# Altium footprint library MCU.PcbLib: 87 footprints (part 5 of 6)
Each footprint in its own frame and in the unit in brackets; x right, y up, seen from the top. Pads: shape width x height; smd on the part's side, far side on the other; paste and mask are expansions set on the pad; w line width, h text height; cw(c..) or ccw(c..) is an arc to the next point about the centre after c.
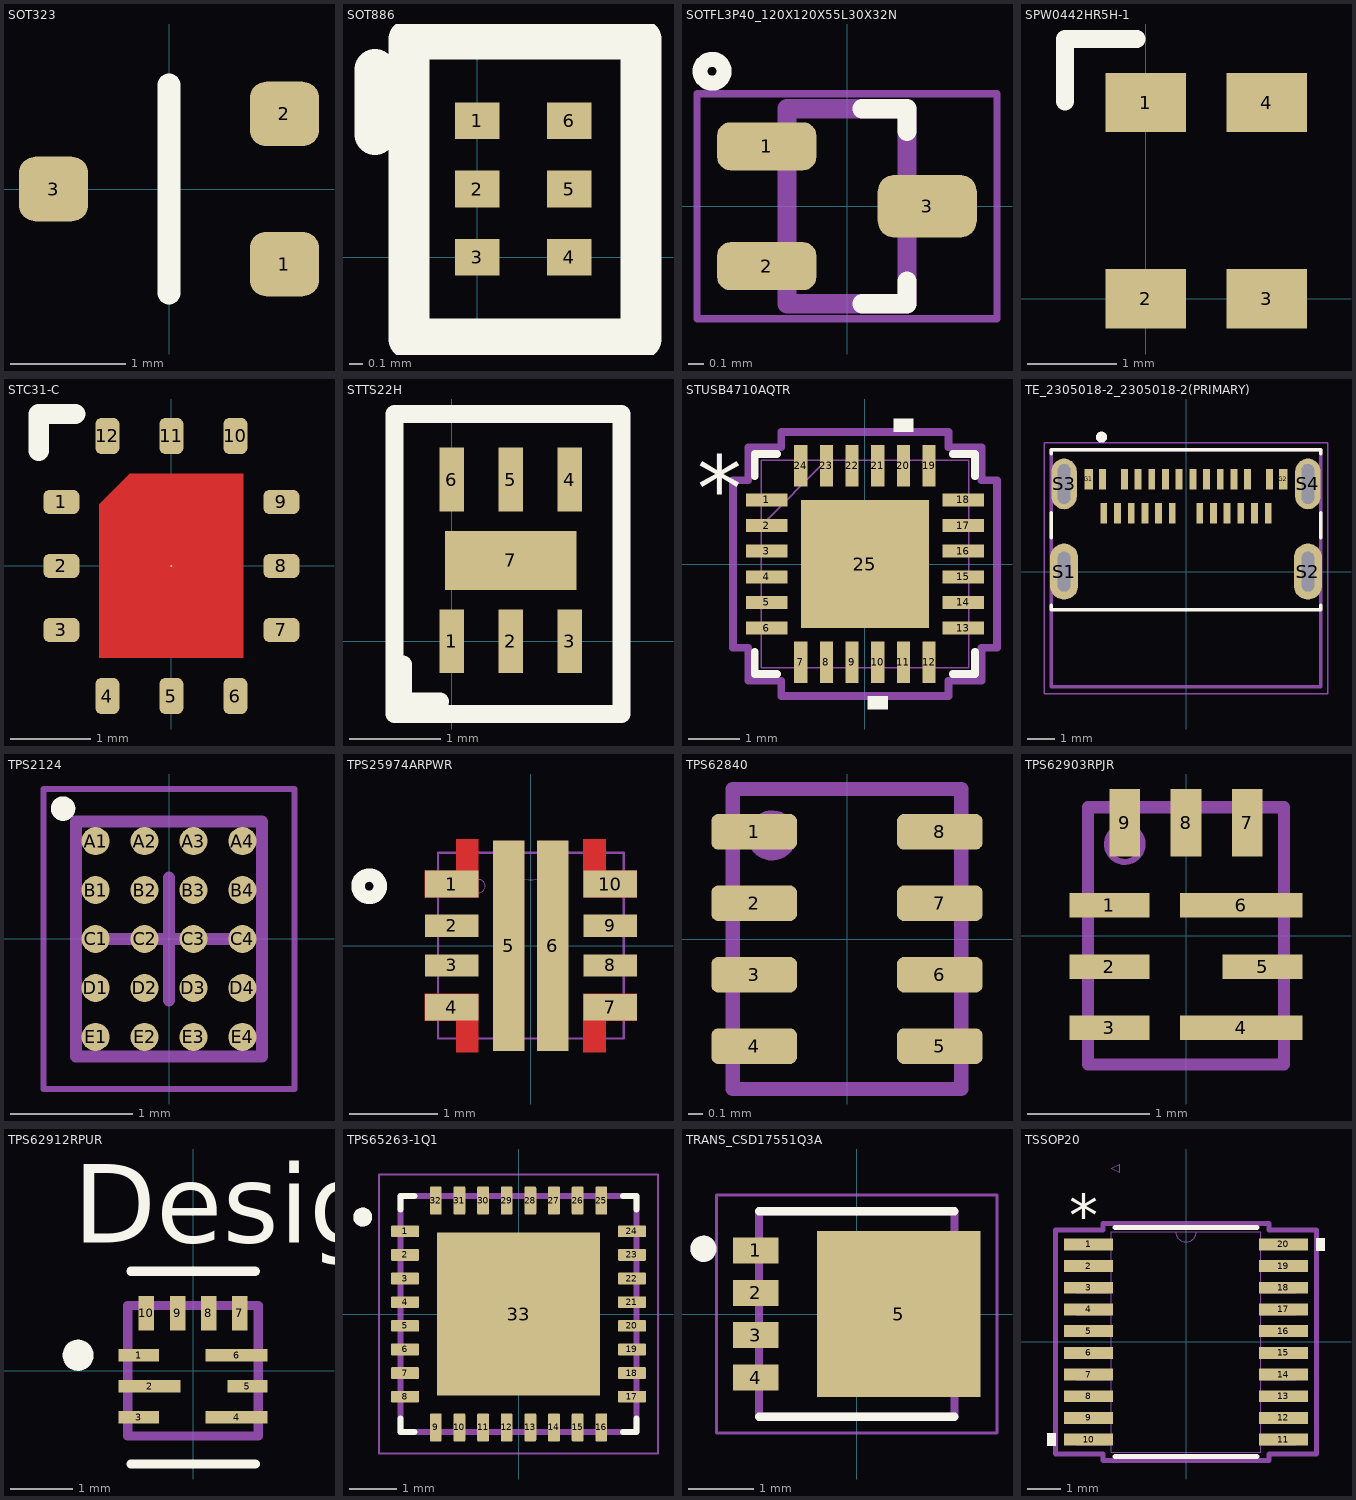
[diagram p4: the footprints below, top view; thin cyan lines are the x and y axes]

## SOT323 [mm] "Si1308EDL"
pads (3):
  rrect50% 0.6x0.559 smd: 1(1,-0.65) 2(1,0.65) 3(-1,0)
Top Overlay:
  lines w0.2: 0,-0.9 0,0.9
3D body "sot323.STEP": height 1.1, standoff 0, extent -1.05,-1 1.05,1

## SOT886 [mm] "PRTR5V0U2F,115"
pads (6):
  rect 0.325x0.27 smd: 1(0,1) 2(0,0.5) 3(0,0) 4(0.675,0) 5(0.675,0.5) 6(0.675,1)
Top Overlay:
  lines w0.3: -0.75,0.9 -0.75,1.375 ; -0.5,-0.6 1.2,-0.6 1.2,1.6 -0.5,1.6 -0.5,-0.6
3D body: height 0.7, standoff 0, extent -0.3,-0.4 1,1.4

## SOTFL3P40_120X120X55L30X32N [mm]
pads (3):
  rrect54% 0.66x0.32 smd: 1(-0.535,0.4) 2(-0.535,-0.4)
  rrect54% 0.66x0.42 smd: 3(0.535,0)
Top Overlay:
  circle w0.1: c-0.9,0.9 r0.08
  lines w0.127: 0.1,-0.65 0.4,-0.65 0.4,-0.5 ; 0.1,0.65 0.4,0.65 0.4,0.5
Mechanical 13:
  lines w0.127: -0.4,-0.65 0.4,-0.65 0.4,0.65 -0.4,0.65 -0.4,-0.65
Mechanical 15:
  lines w0.05: -1,-0.75 1,-0.75 1,0.75 -1,0.75 -1,-0.75
3D body: height 0.6, standoff 0, extent -0.5,-0.7 0.4,0.6

## SPW0442HR5H-1 [mm] "Knowles Microphone"
pads (4):
  rect 0.9x0.66 smd: 1(0,2.19) 2(0,0) 3(1.35,0) 4(1.35,2.19)
Top Overlay:
  lines w0.2: -0.9,2.2 -0.9,2.9 -0.1,2.9
3D body: height 1, standoff 0, extent -0.575,-0.4 1.925,2.6

## STC31-C [mm] "CO2 accuracy of ±(0.2 - 2.0 vol%) @0-100 vol%"
pads (13):
  rrect50% 0.45x0.3 smd: 1(-1.375,0.8) 2(-1.375,0) 3(-1.375,-0.8) 7(1.375,-0.8) 8(1.375,0) 9(1.375,0.8)
  rrect50% 0.3x0.45 smd: 4(-0.8,-1.625) 5(0,-1.625) 6(0.8,-1.625) 10(0.8,1.625) 11(0,1.625) 12(-0.8,1.625)
  round 0.025 smd: 13(0,0)
Top Layer:
  region: -0.9,-1.15 -0.9,0.77 -0.52,1.15 0.9,1.15 0.9,-1.15
Top Overlay:
  lines w0.254: -1.66,1.44 -1.66,1.9 -1.2,1.9
Mechanical 1:
  text ".Designator" at -0.573,-0.106 h0.5
3D body "STC31_STEP_file.step": height 1, standoff 0, extent -1.5,-1.75 1.5,1.75

## STTS22H [mm]
pads (7):
  rect 0.27x0.7 smd: 1(0,0) 2(0.65,0) 3(1.3,0) 4(1.3,1.78) 5(0.65,1.78) 6(0,1.78)
  rect 1.45x0.65 smd: 7(0.65,0.89)
Top Overlay:
  lines w0.2: -0.533,-0.254 -0.533,-0.66 -0.127,-0.66 ; -0.63,-0.799 1.87,-0.799 1.87,2.501 -0.63,2.501 -0.63,-0.799
3D body: height 0.5, standoff 0, extent -0.365,-0.111 1.635,1.889

## STUSB4710AQTR [mm]
pads (25):
  rect 0.808x0.255 smd paste+0 mask+0: 1(-1.915,1.25) 2(-1.915,0.75) 3(-1.915,0.25) 4(-1.915,-0.25) 5(-1.915,-0.75) 6(-1.915,-1.25) 13(1.915,-1.25) 14(1.915,-0.75) 15(1.915,-0.25) 16(1.915,0.25) 17(1.915,0.75) 18(1.915,1.25)
  rect 0.255x0.808 smd paste+0 mask+0: 7(-1.25,-1.915) 8(-0.75,-1.915) 9(-0.25,-1.915) 10(0.25,-1.915) 11(0.75,-1.915) 12(1.25,-1.915) 19(1.25,1.915) 20(0.75,1.915) 21(0.25,1.915) 22(-0.25,1.915) 23(-0.75,1.915) 24(-1.25,1.915)
  rect 2.5x2.5 smd paste-1.384 mask+0: 25(0,0)
Top Overlay:
  region: 0.44,-2.573 0.059,-2.573 0.059,-2.827 0.44,-2.827
  region: 0.941,2.573 0.56,2.573 0.56,2.827 0.941,2.827
  lines w0.152: -2.146,-1.71 -2.146,-2.146 -1.71,-2.146 ; -2.146,1.71 -2.146,2.146 -1.71,2.146 ; 1.71,-2.146 2.146,-2.146 2.146,-1.71 ; 1.71,2.146 2.146,2.146 2.146,1.71
  text "*" at -3.272,0.865 h1.27
Top Paste:
  region: -0.1,1.297 -1.297,1.297 -1.297,0.1 -0.1,0.1
  region: -0.1,-0.1 -1.297,-0.1 -1.297,-1.297 -0.1,-1.297
  region: 1.297,1.297 0.1,1.297 0.1,0.1 1.297,0.1
  region: 1.297,-0.1 0.1,-0.1 0.1,-1.297 1.297,-1.297
Mechanical 13:
  lines w0.025: -2.019,0.749 -0.749,2.019 ; -2.019,-2.019 2.019,-2.019 2.019,2.019 -2.019,2.019 -2.019,-2.019 ; -2.019,-1.402 -2.019,-1.098 -2.019,-1.402 ; -2.019,-0.902 -2.019,-0.598 -2.019,-0.902 ; -2.019,-0.402 -2.019,-0.098 -2.019,-0.402 ; -2.019,0.098 -2.019,0.402 -2.019,0.098 ; -2.019,0.598 -2.019,0.902 -2.019,0.598 ; -2.019,1.098 -2.019,1.402 -2.019,1.098 ; -1.402,-2.019 -1.098,-2.019 -1.402,-2.019 ; -1.402,2.019 -1.098,2.019 -1.402,2.019 ; -0.902,-2.019 -0.598,-2.019 -0.902,-2.019 ; -0.902,2.019 -0.598,2.019 -0.902,2.019 ; -0.402,-2.019 -0.098,-2.019 -0.402,-2.019 ; -0.402,2.019 -0.098,2.019 -0.402,2.019 ; 0.098,-2.019 0.402,-2.019 0.098,-2.019 ; 0.098,2.019 0.402,2.019 0.098,2.019 ; 0.598,-2.019 0.902,-2.019 0.598,-2.019 ; 0.598,2.019 0.902,2.019 0.598,2.019 ; 1.098,-2.019 1.402,-2.019 1.098,-2.019 ; 1.098,2.019 1.402,2.019 1.098,2.019 ; 2.019,-1.402 2.019,-1.098 2.019,-1.402 ; 2.019,-0.902 2.019,-0.598 2.019,-0.902 ; 2.019,-0.402 2.019,-0.098 2.019,-0.402 ; 2.019,0.098 2.019,0.402 2.019,0.098 ; 2.019,0.598 2.019,0.902 2.019,0.598 ; 2.019,1.098 2.019,1.402 2.019,1.098
  text "*" at -1.829,0.865 h1.27
Mechanical 15:
  lines w0.152: -2.573,-1.631 -2.273,-1.631 -2.273,-2.273 -1.631,-2.273 -1.631,-2.573 1.631,-2.573 1.631,-2.273 2.273,-2.273 2.273,-1.631 2.573,-1.631 2.573,1.631 2.273,1.631 2.273,2.273 1.631,2.273 1.631,2.573 -1.631,2.573 -1.631,2.273 -2.273,2.273 -2.273,1.631 -2.573,1.631 -2.573,-1.631
3D body: height 0.25, standoff 0, extent 0,0 0.254,0.254
3D body "QFN24EP_4X4_STM.step": height 0.99, standoff 0, extent -2.019,-2.019 2.019,2.019

## TE_2305018-2_2305018-2(PRIMARY) [mm]
pads (30):
  rect 0.25x0.75 smd: A1(-3.05,3.375) A2(-2.25,3.375) A3(-1.75,3.375) A4(-1.25,3.375) A5(-0.75,3.375) A6(-0.25,3.375) A7(0.25,3.375) A8(0.75,3.375) A9(1.25,3.375) A10(1.75,3.375) A11(2.25,3.375) A12(3.05,3.375) B1(3,2.125) B2(2.5,2.125) B3(2,2.125) B4(1.5,2.125) B5(1,2.125) B6(0.5,2.125) B7(-0.5,2.125) B8(-1,2.125) B9(-1.5,2.125) B10(-2,2.125) B11(-2.5,2.125) B12(-3,2.125)
  rect 0.3x0.75 smd: G1(-3.55,3.375) G2(3.55,3.375)
  oval 1.025x2.05 hole 0.45 slot 1.45 at 90 deg: S1(-4.45,0) S2(4.45,0)
  oval 0.925x1.85 hole 0.45 slot 1.45 at 90 deg: S3(-4.45,3.2) S4(4.45,3.2)
Top Overlay:
  circle w0.2: c-3.085,4.907 r0.1
  lines w0.127: -4.925,-1.231 -4.925,-1.4 4.925,-1.4 4.925,-1.231 ; -4.925,1.231 -4.925,2.155 ; -4.925,4.309 -4.925,4.45 4.925,4.45 4.925,4.309 ; 4.925,1.231 4.925,2.155
Mechanical 1:
  lines w0.001: -4.675,-0.6 ccw(c-4.45,-0.6) -4.45,-0.825 ccw(c-4.45,-0.6) -4.225,-0.6 -4.225,0.6 ccw(c-4.45,0.6) -4.45,0.825 ccw(c-4.45,0.6) -4.675,0.6 -4.675,-0.6 ; -4.675,2.7 ccw(c-4.45,2.7) -4.45,2.475 ccw(c-4.45,2.7) -4.225,2.7 -4.225,3.7 ccw(c-4.45,3.7) -4.45,3.925 ccw(c-4.45,3.7) -4.675,3.7 -4.675,2.7 ; 4.225,-0.6 ccw(c4.45,-0.6) 4.45,-0.825 ccw(c4.45,-0.6) 4.675,-0.6 4.675,0.6 ccw(c4.45,0.6) 4.45,0.825 ccw(c4.45,0.6) 4.225,0.6 4.225,-0.6 ; 4.225,2.7 ccw(c4.45,2.7) 4.45,2.475 ccw(c4.45,2.7) 4.675,2.7 4.675,3.7 ccw(c4.45,3.7) 4.45,3.925 ccw(c4.45,3.7) 4.225,3.7 4.225,2.7
Mechanical 4:
  lines w0.127: -4.925,-4.2 4.925,-4.2 ; -4.925,-4.2 -4.925,4.45 ; -4.925,-4.2 4.925,-4.2 ; -4.925,-4.2 -4.925,4.45 ; -4.925,4.45 4.925,4.45 ; -4.925,4.45 4.925,4.45 ; 4.925,-4.2 4.925,4.45 ; 4.925,-4.2 4.925,4.45
Mechanical 16:
  lines w0.05: -5.175,-4.45 5.175,-4.45 5.175,4.7 -5.175,4.7 -5.175,-4.45
3D body "c-2305018-2-a-3d.stp": height 3.53, standoff -0.53, extent -4.918,-4.198 4.918,4.452

## TPS2124 [mm] "priority power MUX with seamless switchover"
height 0.5
pads (20):
  round 0.23 smd: A1(-0.6,0.8) A2(-0.2,0.8) A3(0.2,0.8) A4(0.6,0.8) B1(-0.6,0.4) B2(-0.2,0.4) B3(0.2,0.4) B4(0.6,0.4) C1(-0.6,0) C2(-0.2,0) C3(0.2,0) C4(0.6,0) D1(-0.6,-0.4) D2(-0.2,-0.4) D3(0.2,-0.4) D4(0.6,-0.4) E1(-0.6,-0.8) E2(-0.2,-0.8) E3(0.2,-0.8) E4(0.6,-0.8)
Top Overlay:
  circle w0.1: c-0.865,1.065 r0.05
Mechanical 13:
  lines w0.1: -0.76,-0.96 0.76,-0.96 0.76,0.96 -0.76,0.96 -0.76,-0.96
Mechanical 15:
  lines w0.05: -1.025,-1.225 1.025,-1.225 1.025,1.225 -1.025,1.225 -1.025,-1.225
  lines w0.1: -0.5,0 0.5,0 ; 0,-0.5 0,0.5
3D body "BGA20C40P4X5_152X192X50.step": height 0.5, standoff 0, extent -0.76,-0.96 0.76,0.96

## TPS25974ARPWR [mil] "eFuse"
pads (10):
  rect 24x12 smd paste-12 mask-12: 1(-35.43,27.56) 4(-35.43,-27.56) 7(35.43,-27.56) 10(35.43,27.56)
  rect 24x10 smd paste-5 mask+0: 2(-35.43,8.86) 3(-35.43,-8.86) 8(35.43,-8.86) 9(35.43,8.86)
  rect 14x94 smd paste-7 mask+0: 5(-9.84,0) 6(9.84,0)
Top Layer:
  region: 47.43,33.56 47.43,21.56 23.43,21.56 23.43,47.56 33.43,47.56 33.43,33.56
  region: -47.43,33.56 -47.43,21.56 -23.43,21.56 -23.43,47.56 -33.43,47.56 -33.43,33.56
  region: 47.43,-33.56 47.43,-21.56 23.43,-21.56 23.43,-47.56 33.43,-47.56 33.43,-33.56
  region: -23.43,-47.56 -23.43,-21.56 -47.43,-21.56 -47.43,-33.56 -33.43,-33.56 -33.43,-47.56
  region: 0,-47
  region: 0,47
Top Overlay:
  circle w6: c-72.29,26.57 r5
Top Paste:
  region: -47.43,33.56 -47.43,21.56 -23.43,21.56 -23.43,47.56 -33.43,47.56 -33.43,33.56
  region: -23.43,-47.56 -23.43,-21.56 -47.43,-21.56 -47.43,-33.56 -33.43,-33.56 -33.43,-47.56
  region: 47.43,33.56 47.43,21.56 23.43,21.56 23.43,47.56 33.43,47.56 33.43,33.56
Top Solder:
  region: -47.43,33.56 -47.43,21.56 -23.43,21.56 -23.43,47.56 -33.43,47.56 -33.43,33.56
  region: -23.43,-47.56 -23.43,-21.56 -47.43,-21.56 -47.43,-33.56 -33.43,-33.56 -33.43,-47.56
  region: 47.43,33.56 47.43,21.56 23.43,21.56 23.43,47.56 33.43,47.56 33.43,33.56
  region: 0,-47
  region: 0,47
Mechanical 13:
  circle w0: c-23.43,26.57 r3
  lines w0: -12,41.5 ccw(c0,41.5) 12,41.5
  lines w1: -41.5,-41.5 -41.5,41.5 41.5,41.5 41.5,-41.5 -41.5,-41.5
3D body "RPW0010A.stp": height 39.37, standoff 0, extent -39.37,-39.37 39.37,39.37

## TPS62840 [mm]
pads (8):
  rrect40% 0.6x0.25 smd: 1(-0.65,0.75) 2(-0.65,0.25) 3(-0.65,-0.25) 4(-0.65,-0.75) 5(0.65,-0.75) 6(0.65,-0.25) 7(0.65,0.25) 8(0.65,0.75)
Mechanical 5:
  circle w0.1: c-0.525,0.725 r0.125
  lines w0.1: -0.8,-1.05 0.8,-1.05 0.8,1.05 -0.8,1.05 -0.8,-1.05
3D body "DLC0008B.stp": height 1, standoff 0, extent -0.75,-1 0.75,1

## TPS62903RPJR [mm]
pads (9):
  rect 0.65x0.2 smd paste+0 mask+0.051: 1(-0.625,0.25) 2(-0.625,-0.25) 3(-0.625,-0.75) 5(0.625,-0.25)
  rect 1x0.2 smd paste+0 mask+0.051: 4(0.45,-0.75) 6(0.45,0.25)
  rect 0.25x0.55 smd paste+0 mask+0.051: 7(0.5,0.925) 8(0,0.925) 9(-0.5,0.925)
Mechanical 13:
  circle w0.05: c-0.5,0.75 r0.146
  lines w0.1: -0.8,-1.05 0.8,-1.05 0.8,1.05 -0.8,1.05 -0.8,-1.05
  text ".Designator" at 0,0 h0.51
3D body "RPJ0009A.stp": height 0.9, standoff 0, extent -0.75,-1 0.75,1

## TPS62912RPUR [mm]
pads (10):
  rect 0.65x0.2 smd paste+0 mask+0: 1(-0.875,0.25) 3(-0.875,-0.75) 5(0.875,-0.25)
  rect 1x0.2 smd paste+0 mask+0: 2(-0.7,-0.25) 4(0.7,-0.75) 6(0.7,0.25)
  rect 0.25x0.55 smd paste+0 mask+0: 7(0.75,0.925) 8(0.25,0.925) 9(-0.25,0.925) 10(-0.75,0.925)
Top Overlay:
  circle w0.25: c-1.85,0.25 r0.125
  lines w0.15: -1,-1.5 1,-1.5 ; -1,1.6 1,1.6
  text "Designator9" at -1.93,2.057 h1.27
Mechanical 13:
  lines w0.15: -1.05,-1.05 -1.05,1.05 1.05,1.05 1.05,-1.05 -1.05,-1.05
  text ".Designator" at 0.05,-0.343 h1.27
3D body: height 0.25, standoff 0, extent 0,0 0.254,0.254
3D body: height 0.76, standoff 0, extent -1.016,-1.016 1.016,1.016

## TPS65263-1Q1 [mm]
pads (33):
  rrect25% 0.6x0.25 smd mask+0: 1(-2.4,1.75) 2(-2.4,1.25) 3(-2.4,0.75) 4(-2.4,0.25) 5(-2.4,-0.25) 6(-2.4,-0.75) 7(-2.4,-1.25) 8(-2.4,-1.75) 17(2.4,-1.75) 18(2.4,-1.25) 19(2.4,-0.75) 20(2.4,-0.25) 21(2.4,0.25) 22(2.4,0.75) 23(2.4,1.25) 24(2.4,1.75)
  rrect25% 0.25x0.6 smd mask+0: 9(-1.75,-2.4) 10(-1.25,-2.4) 11(-0.75,-2.4) 12(-0.25,-2.4) 13(0.25,-2.4) 14(0.75,-2.4) 15(1.25,-2.4) 16(1.75,-2.4) 25(1.75,2.4) 26(1.25,2.4) 27(0.75,2.4) 28(0.25,2.4) 29(-0.25,2.4) 30(-0.75,2.4) 31(-1.25,2.4) 32(-1.75,2.4)
  rect 3.45x3.45 smd paste-3 mask+0: 33(0,0)
Top Overlay:
  circle w0.2: c-3.295,2.05 r0.1
  lines w0.127: -2.5,-2.205 -2.5,-2.5 -2.205,-2.5 ; -2.5,2.205 -2.5,2.5 -2.205,2.5 ; 2.205,-2.5 2.5,-2.5 2.5,-2.205 ; 2.205,2.5 2.5,2.5 2.5,2.205
Top Paste:
  region: -0.1,0.1 -1.59,0.1 -1.59,1.59 -0.1,1.59
  region: 1.59,0.1 0.1,0.1 0.1,1.59 1.59,1.59
  region: -0.1,-1.59 -1.59,-1.59 -1.59,-0.1 -0.1,-0.1
  region: 1.59,-1.59 0.1,-1.59 0.1,-0.1 1.59,-0.1
Top Solder:
  drawing of 33 lines, arcs and shapes, not listed
Mechanical 13:
  circle w0.2: c-3.295,2.05 r0.1
  lines w0.127: -2.5,-2.5 2.5,-2.5 2.5,2.5 -2.5,2.5 -2.5,-2.5
Mechanical 15:
  lines w0.05: -2.95,-2.95 2.95,-2.95 2.95,2.95 -2.95,2.95 -2.95,-2.95
3D body "TPS65263-1QRHBTQ1.STEP": height 1, standoff 0, extent -2.5,-2.5 2.5,2.5

## TRANS_CSD17551Q3A [mm]
pads (5):
  rect 0.7x0.4 smd paste-1 mask+0: 1(-1.55,0.975) 2(-1.55,0.325) 3(-1.55,-0.325) 4(-1.55,-0.975)
  rect 2.51x2.55 smd paste-2 mask+0: 5(0.645,0)
Top Overlay:
  circle w0.2: c-2.35,1 r0.1
  lines w0.127: -1.5,-1.575 1.5,-1.575 ; -1.5,1.575 1.5,1.575
Top Paste:
  region: -1.25,0.825 -1.85,0.825 -1.85,1.125 -1.25,1.125
  region: -1.25,0.175 -1.85,0.175 -1.85,0.475 -1.25,0.475
  region: -1.25,-0.475 -1.85,-0.475 -1.85,-0.175 -1.25,-0.175
  region: -1.25,-1.125 -1.85,-1.125 -1.85,-0.825 -1.25,-0.825
  region: 1.85,0.825 1.25,0.825 1.25,1.125 1.85,1.125
  region: 1.85,0.175 1.25,0.175 1.25,0.475 1.85,0.475
  region: 1.85,-0.475 1.25,-0.475 1.25,-0.175 1.85,-0.175
  region: 1.85,-1.125 1.25,-1.125 1.25,-0.825 1.85,-0.825
  region: 0.145,0.101 -0.56,0.101 -0.56,1.225 0.145,1.225
  region: 1.05,0.101 0.345,0.101 0.345,1.225 1.05,1.225
  region: 0.145,-1.225 -0.56,-1.225 -0.56,-0.101 0.145,-0.101
  region: 1.05,-1.225 0.345,-1.225 0.345,-0.101 1.05,-0.101
Top Solder:
  region: -1.25,0.825 -1.85,0.825 -1.85,1.125 -1.25,1.125
  region: -1.25,0.175 -1.85,0.175 -1.85,0.475 -1.25,0.475
  region: -1.25,-0.475 -1.85,-0.475 -1.85,-0.175 -1.25,-0.175
  region: -1.25,-1.125 -1.85,-1.125 -1.85,-0.825 -1.25,-0.825
  region: 1.215,-1.225 -0.56,-1.225 -0.56,1.225 1.215,1.225
  region: 1.85,-1.125 1.215,-1.125 1.215,-0.825 1.85,-0.825
  region: 1.85,-0.475 1.215,-0.475 1.215,-0.175 1.85,-0.175
  region: 1.85,0.175 1.215,0.175 1.215,0.475 1.85,0.475
  region: 1.85,0.825 1.215,0.825 1.215,1.125 1.85,1.125
Mechanical 13:
  circle w0.2: c-2.35,1 r0.1
  lines w0.127: -1.5,-1.575 1.5,-1.575 1.5,1.575 -1.5,1.575 -1.5,-1.575
Mechanical 15:
  lines w0.05: -2.15,-1.825 2.15,-1.825 2.15,1.825 -2.15,1.825 -2.15,-1.825
3D body: height 0.9, standoff 0, extent -1.5,-1.6 1.5,1.6

## TSSOP20 [mm]
pads (20):
  rect 1.462x0.355 smd paste+0 mask+0: 1(-2.921,2.925) 2(-2.921,2.275) 3(-2.921,1.625) 4(-2.921,0.975) 5(-2.921,0.325) 6(-2.921,-0.325) 7(-2.921,-0.975) 8(-2.921,-1.625) 9(-2.921,-2.275) 10(-2.921,-2.925) 11(2.921,-2.925) 12(2.921,-2.275) 13(2.921,-1.625) 14(2.921,-0.975) 15(2.921,-0.325) 16(2.921,0.325) 17(2.921,0.975) 18(2.921,1.625) 19(2.921,2.275) 20(2.921,2.925)
Top Overlay:
  region: -3.906,-2.734 -4.16,-2.734 -4.16,-3.115 -3.906,-3.115
  region: 3.906,3.115 4.16,3.115 4.16,2.734 3.906,2.734
  lines w0.152: -2.126,-3.429 2.126,-3.429 ; -2.126,3.429 2.126,3.429
  text "*" at -3.492,3.153 h1.27
Mechanical 7:
  lines w0.025: -2.235,5.207 -1.981,5.334 -1.981,5.08 -2.235,5.207
Mechanical 13:
  lines w0: -0.305,3.302 ccw(c0,3.302) 0.305,3.302
  lines w0.025: -3.302,-3.077 -3.302,-2.773 -2.235,-2.773 -2.235,-3.077 -3.302,-3.077 ; -3.302,-2.427 -3.302,-2.123 -2.235,-2.123 -2.235,-2.427 -3.302,-2.427 ; -3.302,-1.777 -3.302,-1.473 -2.235,-1.473 -2.235,-1.777 -3.302,-1.777 ; -3.302,-1.127 -3.302,-0.823 -2.235,-0.823 -2.235,-1.127 -3.302,-1.127 ; -3.302,-0.477 -3.302,-0.173 -2.235,-0.173 -2.235,-0.477 -3.302,-0.477 ; -3.302,0.173 -3.302,0.477 -2.235,0.477 -2.235,0.173 -3.302,0.173 ; -3.302,0.823 -3.302,1.127 -2.235,1.127 -2.235,0.823 -3.302,0.823 ; -3.302,1.473 -3.302,1.777 -2.235,1.777 -2.235,1.473 -3.302,1.473 ; -3.302,2.123 -3.302,2.427 -2.235,2.427 -2.235,2.123 -3.302,2.123 ; -3.302,2.773 -3.302,3.077 -2.235,3.077 -2.235,2.773 -3.302,2.773 ; -2.235,-3.302 2.235,-3.302 2.235,3.302 -2.235,3.302 -2.235,-3.302 ; 2.235,-3.077 2.235,-2.773 3.302,-2.773 3.302,-3.077 2.235,-3.077 ; 2.235,-2.427 2.235,-2.123 3.302,-2.123 3.302,-2.427 2.235,-2.427 ; 2.235,-1.777 2.235,-1.473 3.302,-1.473 3.302,-1.777 2.235,-1.777 ; 2.235,-1.127 2.235,-0.823 3.302,-0.823 3.302,-1.127 2.235,-1.127 ; 2.235,-0.477 2.235,-0.173 3.302,-0.173 3.302,-0.477 2.235,-0.477 ; 2.235,0.173 2.235,0.477 3.302,0.477 3.302,0.173 2.235,0.173 ; 2.235,0.823 2.235,1.127 3.302,1.127 3.302,0.823 2.235,0.823 ; 2.235,1.473 2.235,1.777 3.302,1.777 3.302,1.473 2.235,1.473 ; 2.235,2.123 2.235,2.427 3.302,2.427 3.302,2.123 2.235,2.123 ; 2.235,2.773 2.235,3.077 3.302,3.077 3.302,2.773 2.235,2.773
  text "*" at -2.172,1.956 h1.27
Mechanical 15:
  lines w0.152: -3.906,-3.356 -3.906,3.356 -2.489,3.356 -2.489,3.556 2.489,3.556 2.489,3.356 3.906,3.356 3.906,-3.356 2.489,-3.356 2.489,-3.556 -2.489,-3.556 -2.489,-3.356 -3.906,-3.356
3D body "TSSOP20.step": height 1.2, standoff 0, extent -3.302,-3.302 3.302,3.302
3D body: height 0.25, standoff 0, extent 0,0 0.254,0.254